# Altium footprint library Roket_Library.PcbLib: 45 footprints (part 3 of 3)
Each footprint in its own frame and in the unit in brackets; x right, y up, seen from the top. Pads: shape width x height; smd on the part's side, far side on the other; paste and mask are expansions set on the pad; w line width, h text height; cw(c..) or ccw(c..) is an arc to the next point about the centre after c.
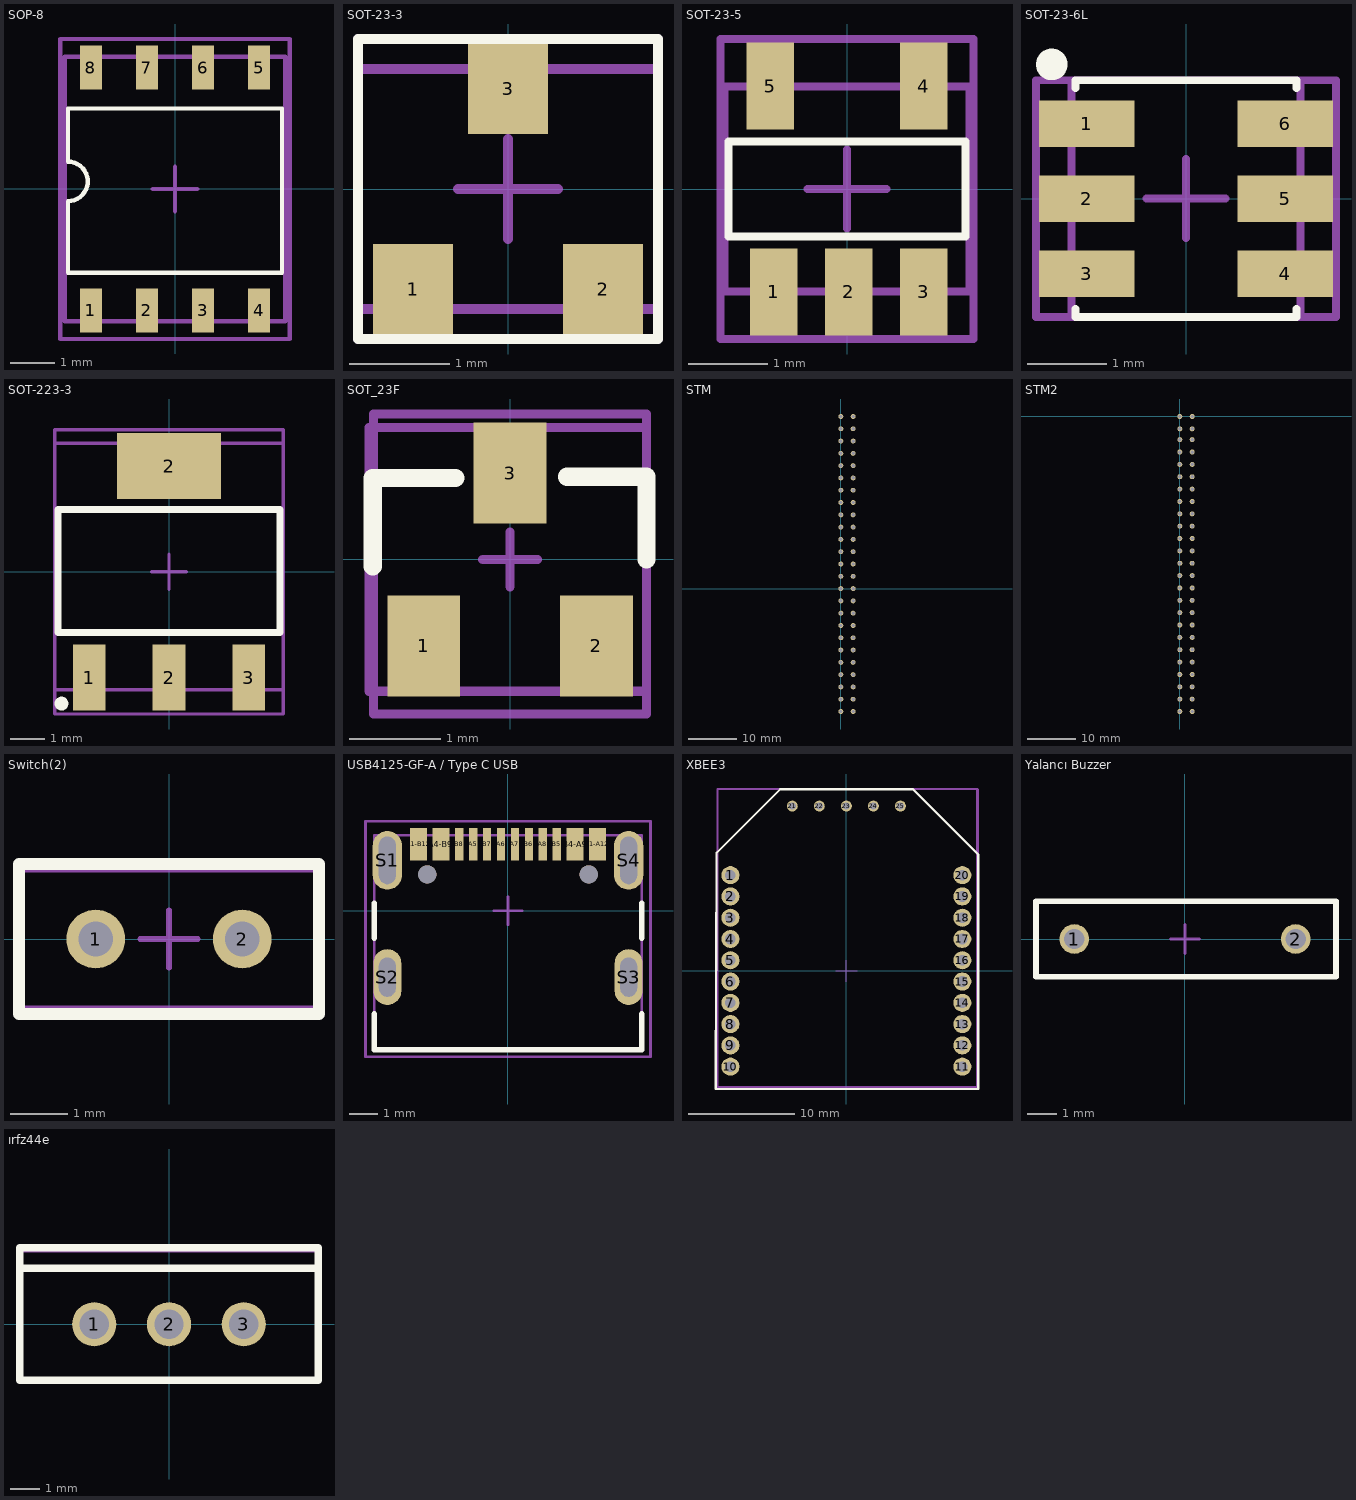
[diagram p2: the footprints below, top view; thin cyan lines are the x and y axes]

## SOP-8 [mm]
pads (8):
  rect 0.5x1 smd mask+0.05: 1(-1.905,-2.75) 2(-0.635,-2.75) 3(0.635,-2.75) 4(1.905,-2.75) 5(1.905,2.75) 6(0.635,2.75) 7(-0.635,2.75) 8(-1.905,2.75)
Top Overlay:
  lines w0.1: -2.425,-1.9 2.425,-1.9 2.425,1.825 -2.425,1.825 -2.425,0.95 -2.425,0.619 cw(c-2.425,0.172) -2.425,-0.275 -2.425,-0.8 -2.425,-1.9
Top 3D Body:
  lines w0.1: -2.5,-3 2.5,-3 2.5,3 -2.5,3 -2.5,-3
Top Component Center:
  lines w0.1: -0.5,0 0.5,0 ; 0,-0.5 0,0.5 ; -2.6,-3.4 -2.6,3.4 2.6,3.4 2.6,-3.4 -2.6,-3.4
Top Designator:
  lines w0.1: -2.6,-3.4 -2.6,3.4 2.6,3.4 2.6,-3.4 -2.6,-3.4
  text "'.Designator'" at -3.4,-0.9 h1
3D body "User Library-sop8_model.STEP": height 1.57, standoff 0.01, extent -2.439,-3.016 2.461,2.964

## SOT-23-3 [mm]
pads (3):
  rect 0.8x0.9 smd mask+0.05: 1(-0.95,-1) 2(0.95,-1) 3(0,1)
Top Overlay:
  lines w0.1: -1.5,-1.5 1.5,-1.5 1.5,1.5 -1.5,1.5 -1.5,-1.5
Top 3D Body:
  lines w0.1: -1.5,-1.2 1.5,-1.2 1.5,1.2 -1.5,1.2 -1.5,-1.2
Top Component Center:
  lines w0.1: -0.5,0 0.5,0 ; 0,-0.5 0,0.5 ; -1.5,-1.5 1.5,-1.5 1.5,1.5 -1.5,1.5 -1.5,-1.5
Top Designator:
  lines w0.1: -1.5,-1.5 -1.5,1.5 1.5,1.5 1.5,-1.5 -1.5,-1.5
  text "'.Designator'" at -2.1,-0.5 h0.6
3D body "2n7002.stp": height 1.01, standoff 0.01, extent -1.45,-1.15 1.45,1.15

## SOT-23-5 [mm]
pads (5):
  rect 0.6x1.1 smd mask+0.05: 1(-0.927,-1.304) 2(0.023,-1.304) 3(0.973,-1.304) 4(0.973,1.304) 5(-0.973,1.304)
Top Overlay:
  lines w0.1: -1.5,-0.6 1.5,-0.6 1.5,0.6 -1.5,0.6 -1.5,-0.6
Top 3D Body:
  lines w0.1: -1.55,-1.3 1.55,-1.3 1.55,1.3 -1.55,1.3 -1.55,-1.3
Top Component Center:
  lines w0.1: -0.5,0 0.5,0 ; 0,-0.5 0,0.5 ; -1.6,-1.9 -1.6,1.9 1.6,1.9 1.6,-1.9 -1.6,-1.9
Top Designator:
  lines w0.1: -1.6,-1.9 1.6,-1.9 1.6,1.9 -1.6,1.9 -1.6,-1.9
  text "'.Designator'" at -2.2,-0.7 h0.7
3D body "CircuitWorks-SOT-23-5.step": height 1.11, standoff 0.01, extent -1.5,-1.25 1.5,1.25

## SOT-23-6L [mm]
pads (6):
  rect 1.21x0.59 smd mask+0.05: 1(-1.255,0.95) 2(-1.255,0) 3(-1.255,-0.95) 4(1.255,-0.95) 5(1.255,0) 6(1.255,0.95)
Top Overlay:
  circle w0.2: c-1.7,1.7 r0.1
  lines w0.1: -1.4,-1.4 -1.4,-1.5 1.4,-1.5 1.4,-1.4 ; -1.4,1.4 -1.4,1.5 1.4,1.5 1.4,1.4
Top 3D Body:
  lines w0.1: -1.45,-1.5 -1.45,1.5 1.45,1.5 1.45,-1.5 -1.45,-1.5
Top Component Center:
  lines w0.1: -0.5,0 0.5,0 ; 0,-0.5 0,0.5 ; -1.9,-1.5 1.9,-1.5 1.9,1.5 -1.4,1.5 -1.9,1.5 -1.9,-1.5
Top Designator:
  lines w0.1: -1.9,-1.5 1.9,-1.5 1.9,1.5 -1.4,1.5 -1.9,1.5 -1.9,-1.5
  text "'.Designator'" at -2.1,-1.5 h1.4
3D body "usblc6-2sc6.stp": height 1.18, standoff 0, extent -1.4,-1.446 1.4,1.45

## SOT-223-3 [mm]
pads (5):
  rect 0.95x1.9 smd mask+0.05: 1(-2.3,-3.05) 2(0,-3.05) 3(2.3,-3.05) ""(-2.3,-3.05)
  rect 3x1.9 smd mask+0.05: 2(0,3.05)
Top Overlay:
  circle w0.2: c-3.1,-3.8 r0.1
  lines w0.2: -3.2,-1.75 -3.2,1.8 3.2,1.8 3.2,-1.75 -3.2,-1.75
Top 3D Body:
  lines w0.1: -3.3,-3.4 -3.3,3.7 3.3,3.7 3.3,-3.4 -3.3,-3.4
Top Component Center:
  lines w0.1: -0.5,0 0.5,0 ; 0,-0.5 0,0.5 ; -3.3,-4.1 3.3,-4.1 3.3,4.1 -3.3,4.1 -3.3,-4.1
Top Designator:
  lines w0.1: -3.3,-4.1 -3.3,4.1 3.3,4.1 3.3,-4.1 -3.3,-4.1
  text "'.Designator'" at -4.1,-0.9 h1
3D body "DB.STEP": height 1.8, standoff 0, extent -3.25,-3.349 3.25,3.649

## SOT_23F [mm]
pads (3):
  rect 0.8x1.11 smd mask+0.05: 1(-0.95,-0.95) 2(0.95,-0.95) 3(0,0.95)
Top Overlay:
  lines w0.2: -1.51,-0.075 -1.51,0.896 -0.6,0.896 ; 0.625,0.91 1.5,0.91 1.5,0
Top 3D Body:
  lines w0.1: -1.55,-1.45 1.5,-1.45 1.5,1.45 -1.55,1.45 -1.55,-1.45
Top Component Center:
  lines w0.1: -0.3,0 0.3,0 ; 0,-0.3 0,0.3 ; -1.5,-1.7 1.5,-1.7 1.5,1.6 -1.5,1.6 -1.5,-1.7
Top Designator:
  lines w0.1: -1.5,-1.7 -1.5,1.6 1.5,1.6 1.5,-1.7 -1.5,-1.7
  text "'.Designator'" at -1.5,-1 h1
3D body "SOT23-3.stp": height 1.2, standoff 0.02, extent -1.5,-1.418 1.5,1.418

## STM [mm]
pads (50):
  round 1.02 hole 0.7 mask+0.05: 1(0,35.56) 2(0,33.02) 3(0,30.48) 4(0,27.94) 5(0,25.4) 6(0,22.86) 7(0,20.32) 8(0,17.78) 9(0,15.24) 10(0,12.7) 11(0,10.16) 12(0,7.62) 13(0,5.08) 14(0,2.54) 15(0,0) 16(0,-2.54) 17(0,-5.08) 18(0,-7.62) 19(0,-10.16) 20(0,-12.7) 21(0,-15.24) 22(0,-17.78) 23(0,-20.32) 24(0,-22.86) 25(0,-25.4) 26(2.54,35.56) 27(2.54,33.02) 28(2.54,30.48) 29(2.54,27.94) 30(2.54,25.4) 31(2.54,22.86) 32(2.54,20.32) 33(2.54,17.78) 34(2.54,15.24) 35(2.54,12.7) 36(2.54,10.16) 37(2.54,7.62) 38(2.54,5.08) 39(2.54,2.54) 40(2.54,0) 41(2.54,-2.54) 42(2.54,-5.08) 43(2.54,-7.62) 44(2.54,-10.16) 45(2.54,-12.7) 46(2.54,-15.24) 47(2.54,-17.78) 48(2.54,-20.32) 49(2.54,-22.86) 50(2.54,-25.4)

## STM2 [mm]
pads (50):
  round 1.02 hole 0.7 mask+0.05: 51(0,0) 52(0,-2.54) 53(0,-4.774) 54(0,-7.314) 55(0,-9.854) 56(0,-12.394) 57(0,-14.934) 58(0,-17.474) 59(0,-20.014) 60(0,-22.554) 61(0,-25.094) 62(0,-27.634) 63(0,-30.174) 64(0,-32.714) 65(0,-35.254) 66(0,-37.794) 67(0,-40.334) 68(0,-42.874) 69(0,-45.414) 70(0,-47.954) 71(0,-50.494) 72(0,-53.034) 73(0,-55.574) 74(0,-58.114) 75(0,-60.654) 76(2.54,0) 77(2.54,-2.54) 78(2.54,-4.774) 79(2.54,-7.314) 80(2.54,-9.854) 81(2.54,-12.394) 82(2.54,-14.934) 83(2.54,-17.474) 84(2.54,-20.014) 85(2.54,-22.554) 86(2.54,-25.094) 87(2.54,-27.634) 88(2.54,-30.174) 89(2.54,-32.714) 90(2.54,-35.254) 91(2.54,-37.794) 92(2.54,-40.334) 93(2.54,-42.874) 94(2.54,-45.414) 95(2.54,-47.954) 96(2.54,-50.494) 97(2.54,-53.034) 98(2.54,-55.574) 99(2.54,-58.114) 100(2.54,-60.654)

## Switch(2) [mm]
pads (2):
  round 1.02 hole 0.6 mask+0.05: 1(-1.27,0) 2(1.27,0)
Top Overlay:
  lines w0.2: -2.6,-1.3 -2.6,1.3 2.6,1.3 2.6,-1.3 -2.6,-1.3
Top 3D Body:
  lines w0.1: -2.6,-1.2 -2.6,1.2 2.6,1.2 2.6,-1.2 -2.6,-1.2
Top Component Center:
  lines w0.1: -0.5,0 0.5,0 ; 0,-0.5 0,0.5 ; -2.6,-1.3 2.6,-1.3 2.6,1.3 -2.6,1.3 -2.6,-1.3
Top Designator:
  lines w0.1: -2.6,-1.3 2.6,-1.3 2.6,1.3 -2.6,1.3 -2.6,-1.3
  text "'.Designator'" at -2.4,-0.3 h0.4

## USB4125-GF-A / Type C USB [mm]
pads (18):
  rect 0.6x1.15 smd mask+0.05: A1-B12(-3.2,2.378) A4-B9(-2.4,2.378) B1-A12(3.2,2.378) B4-A9(2.4,2.378)
  rect 0.3x1.15 smd mask+0.05: A5(-1.25,2.378) A6(-0.25,2.378) A7(0.25,2.378) A8(1.25,2.378) B5(1.75,2.378) B6(0.75,2.378) B7(-0.75,2.378) B8(-1.75,2.378)
  oval 1.05x2.1 hole 0.6 slot 1.7 at 90 deg: S1(-4.32,1.803) S4(4.32,1.803)
  oval 1x2 hole 0.6 slot 1.4 at 90 deg: S2(-4.32,-2.377) S3(4.32,-2.377)
  round 0.65 hole 0.65 unplated: ""(-2.89,1.303) ""(2.89,1.303)
Top Overlay:
  lines w0.2: -4.79,-3.697 -4.79,-4.977 4.79,-4.977 4.79,-3.697 ; -4.79,-0.977 -4.79,0.273 ; 4.79,-0.977 4.79,0.273
Top 3D Body:
  lines w0.1: -4.79,-4.977 4.79,-4.977 4.79,2.7 -4.79,2.7 -4.79,-4.977
Top Component Center:
  lines w0.1: -0.5,0 0.5,0 ; 0,-0.5 0,0.5 ; -5.1,-5.227 5.1,-5.227 5.1,3.203 -5.1,3.203 -5.1,-5.227
Top Designator:
  lines w0.1: -5.1,-5.227 -5.1,3.203 5.1,3.203 5.1,-5.227 -5.1,-5.227
  text "'.Designator'" at -5.6,-1.9 h1
3D body "step_temp.STEP": height 3.31, standoff -0.85, extent -4.79,-4.977 4.79,2.733

## XBEE3 [mm]
pads (25):
  round 1.7 hole 1 mask+0.05: 1(-10.9,9) 2(-10.9,7) 3(-10.9,5) 4(-10.9,3) 5(-10.9,1) 6(-10.9,-1) 7(-10.9,-3) 8(-10.9,-5) 9(-10.9,-7) 10(-10.9,-9) 11(10.9,-9) 12(10.9,-7) 13(10.9,-5) 14(10.9,-3) 15(10.9,-1) 16(10.9,1) 17(10.9,3) 18(10.9,5) 19(10.9,7) 20(10.9,9)
  round 1.02 hole 0.7 mask+0.05: 21(-5.08,15.5) 22(-2.54,15.5) 23(0,15.5) 24(2.54,15.5) 25(5.08,15.5)
Top Overlay:
  lines w0.2: -12.282,-11.1 -12.198,11.11 -6.225,17.082 6.268,17.082 12.4,10.95 12.4,-11.1 -12.282,-11.1
Top 3D Body:
  lines w0.2: -12.1,-10.9 12.3,-10.9 12.3,17.1 -12.1,17.1 -12.1,-10.9
Top Component Center:
  lines w0.1: -1,0 1,0 ; 0,-1 0,1 ; -12.1,-11.1 12.4,-11.1 12.4,17.1 -12.1,17.1 -12.1,-11.1
Top Designator:
  lines w0.1: -12.1,-11.1 12.3,-11.1 12.3,17.1 -12.1,17.1 -12.1,-11.1
  text "'.Designator'" at -11.55,-1.775 h2

## Yalancı Buzzer [mm]
pads (2):
  round 1.02 hole 0.7 mask+0.05: 1(-3.81,0) 2(3.81,0)
Top Overlay:
  lines w0.2: -5.13,-1.3 -5.13,1.3 5.2,1.3 5.2,-1.3 -5.13,-1.3
Top 3D Body:
  lines w0.1: -5.13,-1.3 -5.13,1.3 5.2,1.3 5.2,-1.3 -5.13,-1.3
Top Component Center:
  lines w0.1: -0.5,0 0.5,0 ; 0,-0.5 0,0.5 ; -5.13,-1.3 -5.13,1.3 5.2,1.3 5.2,-1.3 -5.13,-1.3
Top Designator:
  lines w0.1: -5.13,-1.3 -5.13,1.3 5.2,1.3 5.2,-1.3 -5.13,-1.3
  text "'.Designator'" at -5.6,-0.9 h1

## ırfz44e [mm]
pads (3):
  round 1.5 hole 1: 1(-2.54,0) 2(0,0) 3(2.54,0)
Top Overlay:
  lines w0.254: -5.08,1.905 -5.08,2.6 5.08,2.6 5.08,1.905 ; -5.08,1.905 5.08,1.905 ; -5.08,1.905 -5.08,-1.905 5.08,-1.905 5.08,1.905
Top 3D Body:
  lines w0.203: -5.08,1.905 -5.08,2.54 5.08,2.54 5.08,1.905 ; -4.318,-1.905 4.318,-1.905
Top Component Center:
  lines w0.1: -0.5,0 0.5,0 ; 0,-0.5 0,0.5 ; -5.1,-1.9 5.1,-1.9 5.1,2.6 -5.1,2.6 -5.1,-1.9
Top Designator:
  lines w0.1: -5.1,-1.9 5.1,-1.9 5.1,2.6 -5.1,2.6 -5.1,-1.9
  text "'.Designator'" at -3.5,-0.4 h0.6
3D body "step_temp.STEP": height 20.57, standoff -10.67, extent -5.08,-1.473 5.08,2.718